# Altium footprint library CONN_TBLOCK_3P5_B.PcbLib: 36 footprints (part 1 of 3)
Each footprint in its own frame and in the unit in brackets; x right, y up, seen from the top. Pads: shape width x height; smd on the part's side, far side on the other; paste and mask are expansions set on the pad; w line width, h text height; cw(c..) or ccw(c..) is an arc to the next point about the centre after c.
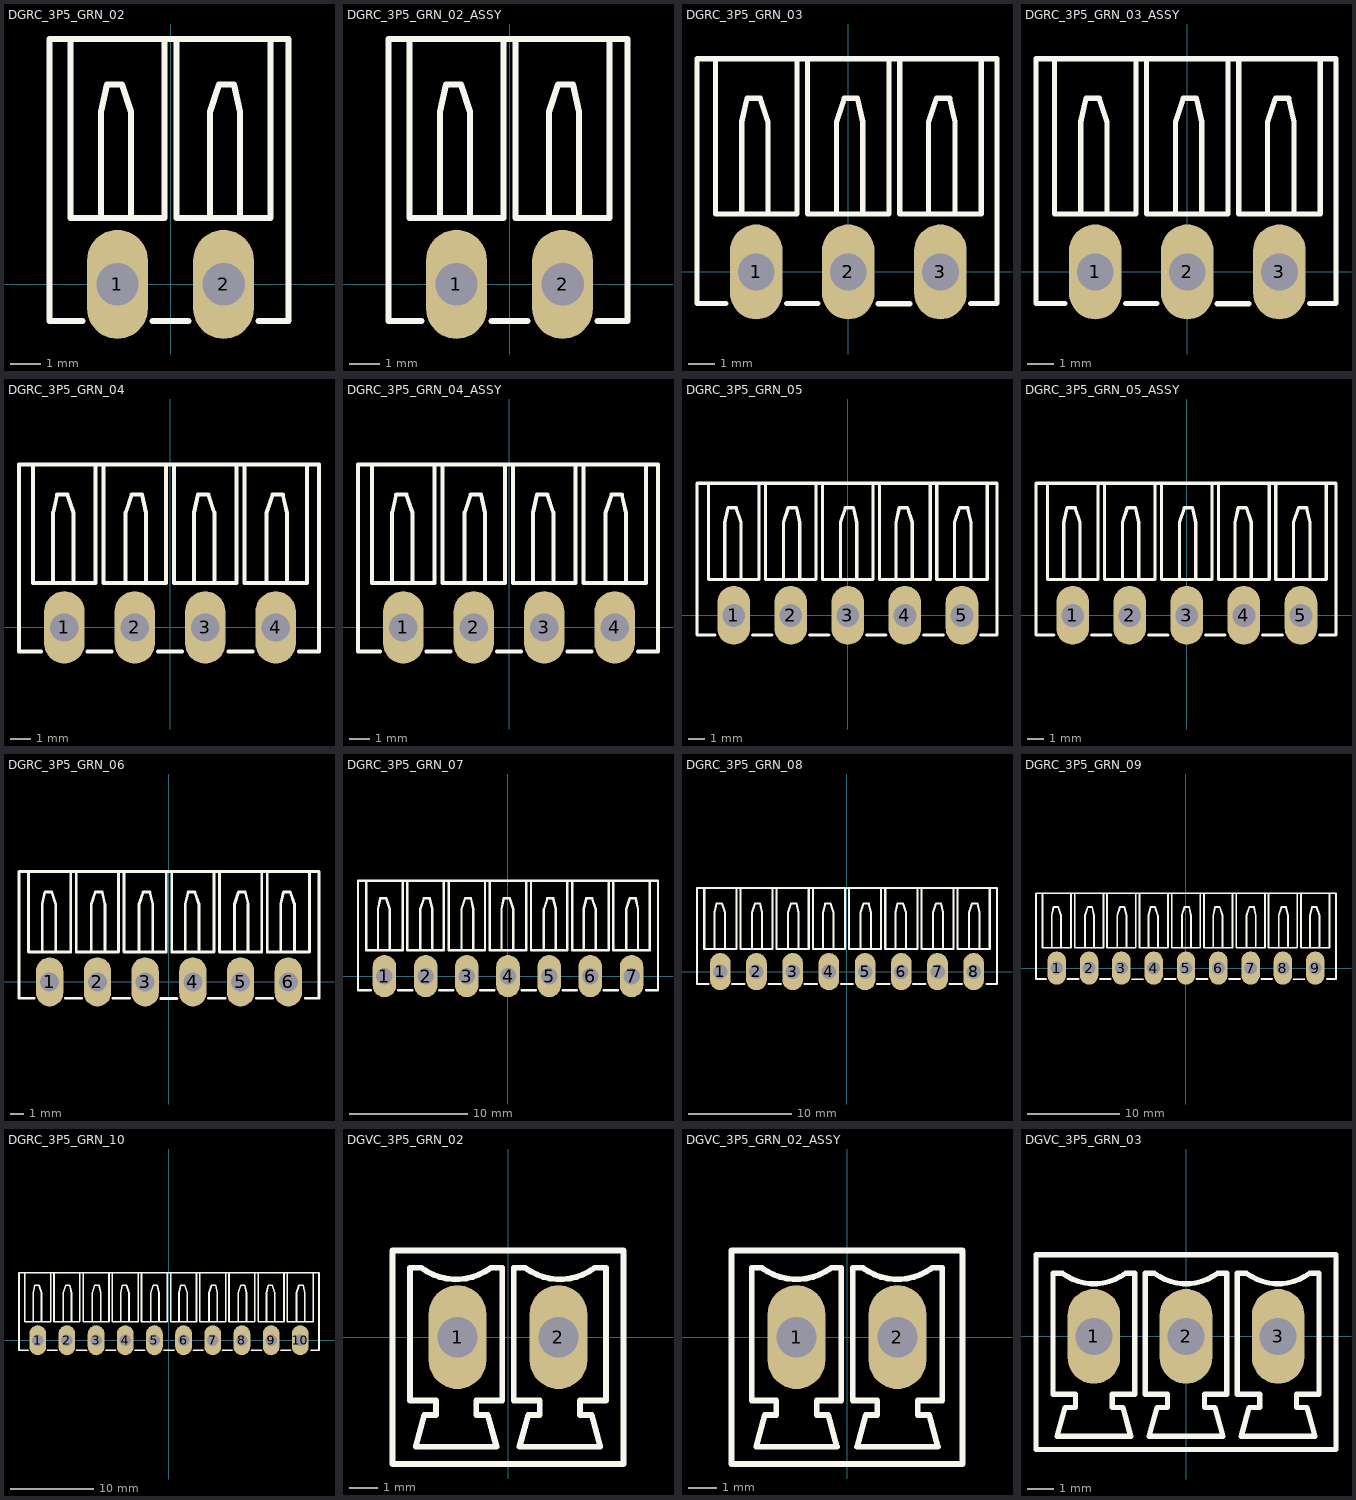
[diagram p0: the footprints below, top view; thin cyan lines are the x and y axes]

## DGRC_3P5_GRN_02 [mm] "Terminal Block Pluggable, 15EDGRC-3.5-0xP-14, Green, 8A/300v"
height 7
pads (2):
  oval 2x3.6 hole 1.4: 1(-1.75,0) 2(1.75,0)
Top Overlay:
  lines w0.2: -3.3,8.1 -3.3,2.2 -0.2,2.2 -0.2,8.1 ; -2.9,-1.2 -4,-1.2 -4,8.1 3.9,8.1 3.9,-1.2 2.9,-1.2 ; -2.3,2.2 -2.3,5.7 -2.1,6.6 -1.6,6.6 -1.3,5.7 -1.3,2.2 ; -0.6,-1.2 0.6,-1.2 ; 0.2,8.1 0.2,2.2 3.3,2.2 3.3,8.1 ; 1.3,2.2 1.3,5.7 1.6,6.6 2.1,6.6 2.3,5.7 2.3,2.2
3D body "15EDGRC-3.5-02P-14-00AH.STEP": height 7.3, standoff -3.4, extent -3.928,-1.143 3.872,8.057

## DGRC_3P5_GRN_02_ASSY [mm] "Terminal Block Pluggable, 15EDGRC-3.5-0xP-14, Green, 8A/300v"
height 7
pads (2):
  oval 2x3.6 hole 1.4: 1(-1.75,0) 2(1.75,0)
Top Overlay:
  lines w0.2: -3.3,8.1 -3.3,2.2 -0.2,2.2 -0.2,8.1 ; -2.9,-1.2 -4,-1.2 -4,8.1 3.9,8.1 3.9,-1.2 2.9,-1.2 ; -2.3,2.2 -2.3,5.7 -2.1,6.6 -1.6,6.6 -1.3,5.7 -1.3,2.2 ; -0.6,-1.2 0.6,-1.2 ; 0.2,8.1 0.2,2.2 3.3,2.2 3.3,8.1 ; 1.3,2.2 1.3,5.7 1.6,6.6 2.1,6.6 2.3,5.7 2.3,2.2
3D body "15EDG-3.5-2P(H-Vwt).STEP": height 8.76, standoff -2.5, extent -3.928,-1.171 3.872,16.967

## DGRC_3P5_GRN_03 [mm] "Terminal Block Pluggable, 15EDGRC-3.5-0xP-14, Green, 8A/300v"
height 7
pads (3):
  oval 2x3.6 hole 1.4: 1(-3.5,0) 2(0,0) 3(3.5,0)
Top Overlay:
  lines w0.2: -5.05,8.1 -5.05,2.2 -1.95,2.2 -1.95,8.1 ; -4.65,-1.2 -5.75,-1.2 -5.75,8.1 5.65,8.1 5.65,-1.2 4.65,-1.2 ; -4.05,2.2 -4.05,5.7 -3.85,6.6 -3.35,6.6 -3.05,5.7 -3.05,2.2 ; -2.35,-1.2 -1.15,-1.2 ; -1.55,8.1 -1.55,2.2 1.55,2.2 1.55,8.1 ; -0.45,2.2 -0.45,5.7 -0.15,6.6 0.35,6.6 0.55,5.7 0.55,2.2 ; 1.142,-1.208 2.342,-1.208 ; 1.95,8.1 1.95,2.2 5.05,2.2 5.05,8.1 ; 3.05,2.2 3.05,5.7 3.35,6.6 3.85,6.6 4.05,5.7 4.05,2.2
3D body "15EDGRC-3.5-03P-14-00AH.STEP": height 7.41, standoff -3.29, extent -5.706,-1.143 5.594,8.057

## DGRC_3P5_GRN_03_ASSY [mm] "Terminal Block Pluggable, 15EDGRC-3.5-0xP-14, Green, 8A/300v"
height 7
pads (3):
  oval 2x3.6 hole 1.4: 1(-3.5,0) 2(0,0) 3(3.5,0)
Top Overlay:
  lines w0.2: -5.05,8.1 -5.05,2.2 -1.95,2.2 -1.95,8.1 ; -4.65,-1.2 -5.75,-1.2 -5.75,8.1 5.65,8.1 5.65,-1.2 4.65,-1.2 ; -4.05,2.2 -4.05,5.7 -3.85,6.6 -3.35,6.6 -3.05,5.7 -3.05,2.2 ; -2.35,-1.2 -1.15,-1.2 ; -1.55,8.1 -1.55,2.2 1.55,2.2 1.55,8.1 ; -0.45,2.2 -0.45,5.7 -0.15,6.6 0.35,6.6 0.55,5.7 0.55,2.2 ; 1.142,-1.208 2.342,-1.208 ; 1.95,8.1 1.95,2.2 5.05,2.2 5.05,8.1 ; 3.05,2.2 3.05,5.7 3.35,6.6 3.85,6.6 4.05,5.7 4.05,2.2
3D body "15EDG-3.5-3P(H-Vwt).STEP": height 9.94, standoff -1.32, extent -5.692,-1.222 5.608,16.916

## DGRC_3P5_GRN_04 [mm] "Terminal Block Pluggable, 15EDGRC-3.5-0xP-14, Green, 8A/300v"
height 7
pads (4):
  oval 2x3.6 hole 1.4: 1(-5.25,0) 2(-1.75,0) 3(1.75,0) 4(5.25,0)
Top Overlay:
  lines w0.2: -6.8,8.1 -6.8,2.2 -3.7,2.2 -3.7,8.1 ; -6.4,-1.2 -7.5,-1.2 -7.5,8.1 7.4,8.1 7.4,-1.2 6.4,-1.2 ; -5.8,2.2 -5.8,5.7 -5.6,6.6 -5.1,6.6 -4.8,5.7 -4.8,2.2 ; -4.1,-1.2 -2.9,-1.2 ; -3.3,8.1 -3.3,2.2 -0.2,2.2 -0.2,8.1 ; -2.2,2.2 -2.2,5.7 -1.9,6.6 -1.4,6.6 -1.2,5.7 -1.2,2.2 ; -0.6,-1.2 0.6,-1.2 ; 0.2,8.1 0.2,2.2 3.3,2.2 3.3,8.1 ; 1.2,2.2 1.2,5.7 1.4,6.6 1.9,6.6 2.2,5.7 2.2,2.2 ; 2.9,-1.2 4.1,-1.2 ; 3.7,8.1 3.7,2.2 6.8,2.2 6.8,8.1 ; 4.8,2.2 4.8,5.7 5.1,6.6 5.6,6.6 5.8,5.7 5.8,2.2
3D body "15EDGRC-3.5-04P-14-00AH.STEP": height 7.41, standoff -3.29, extent -7.357,-1.143 7.443,8.057

## DGRC_3P5_GRN_04_ASSY [mm] "Terminal Block Pluggable, 15EDGRC-3.5-0xP-14, Green, 8A/300v"
height 7
pads (4):
  oval 2x3.6 hole 1.4: 1(-5.25,0) 2(-1.75,0) 3(1.75,0) 4(5.25,0)
Top Overlay:
  lines w0.2: -6.8,8.1 -6.8,2.2 -3.7,2.2 -3.7,8.1 ; -6.4,-1.2 -7.5,-1.2 -7.5,8.1 7.4,8.1 7.4,-1.2 6.4,-1.2 ; -5.8,2.2 -5.8,5.7 -5.6,6.6 -5.1,6.6 -4.8,5.7 -4.8,2.2 ; -4.1,-1.2 -2.9,-1.2 ; -3.3,8.1 -3.3,2.2 -0.2,2.2 -0.2,8.1 ; -2.2,2.2 -2.2,5.7 -1.9,6.6 -1.4,6.6 -1.2,5.7 -1.2,2.2 ; -0.6,-1.2 0.6,-1.2 ; 0.2,8.1 0.2,2.2 3.3,2.2 3.3,8.1 ; 1.2,2.2 1.2,5.7 1.4,6.6 1.9,6.6 2.2,5.7 2.2,2.2 ; 2.9,-1.2 4.1,-1.2 ; 3.7,8.1 3.7,2.2 6.8,2.2 6.8,8.1 ; 4.8,2.2 4.8,5.7 5.1,6.6 5.6,6.6 5.8,5.7 5.8,2.2
3D body "15EDG-3.5-4P(H-Vwt).STEP": height 8.76, standoff -2.5, extent -7.428,-1.171 7.372,16.967

## DGRC_3P5_GRN_05 [mm] "Terminal Block Pluggable, 15EDGRC-3.5-0xP-14, Green, 8A/300v"
height 7
pads (5):
  oval 2x3.6 hole 1.4: 1(-7,0) 2(-3.5,0) 3(0,0) 4(3.5,0) 5(7,0)
Top Overlay:
  lines w0.2: -8.55,8.1 -8.55,2.2 -5.45,2.2 -5.45,8.1 ; -8.15,-1.2 -9.25,-1.2 -9.25,8.1 9.15,8.1 9.15,-1.2 8.15,-1.2 ; -7.55,2.2 -7.55,5.7 -7.35,6.6 -6.85,6.6 -6.55,5.7 -6.55,2.2 ; -5.85,-1.2 -4.65,-1.2 ; -5.05,8.1 -5.05,2.2 -1.95,2.2 -1.95,8.1 ; -3.95,2.2 -3.95,5.7 -3.65,6.6 -3.15,6.6 -2.95,5.7 -2.95,2.2 ; -2.35,-1.2 -1.15,-1.2 ; -1.55,8.1 -1.55,2.2 1.55,2.2 1.55,8.1 ; -0.45,2.2 -0.45,5.7 -0.15,6.6 0.35,6.6 0.55,5.7 0.55,2.2 ; 1.142,-1.208 2.342,-1.208 ; 1.95,8.1 1.95,2.2 5.05,2.2 5.05,8.1 ; 2.95,2.2 2.95,5.7 3.15,6.6 3.65,6.6 3.95,5.7 3.95,2.2 ; 4.65,-1.2 5.85,-1.2 ; 5.45,8.1 5.45,2.2 8.55,2.2 8.55,8.1 ; 6.55,2.2 6.55,5.7 6.85,6.6 7.35,6.6 7.55,5.7 7.55,2.2
3D body "15EDGRC-3.5-05P-14-00AH.STEP": height 7.41, standoff -3.29, extent -9.178,-1.211 9.122,7.989

## DGRC_3P5_GRN_05_ASSY [mm] "Terminal Block Pluggable, 15EDGRC-3.5-0xP-14, Green, 8A/300v"
height 7
pads (5):
  oval 2x3.6 hole 1.4: 1(-7,0) 2(-3.5,0) 3(0,0) 4(3.5,0) 5(7,0)
Top Overlay:
  lines w0.2: -8.55,8.1 -8.55,2.2 -5.45,2.2 -5.45,8.1 ; -8.15,-1.2 -9.25,-1.2 -9.25,8.1 9.15,8.1 9.15,-1.2 8.15,-1.2 ; -7.55,2.2 -7.55,5.7 -7.35,6.6 -6.85,6.6 -6.55,5.7 -6.55,2.2 ; -5.85,-1.2 -4.65,-1.2 ; -5.05,8.1 -5.05,2.2 -1.95,2.2 -1.95,8.1 ; -3.95,2.2 -3.95,5.7 -3.65,6.6 -3.15,6.6 -2.95,5.7 -2.95,2.2 ; -2.35,-1.2 -1.15,-1.2 ; -1.55,8.1 -1.55,2.2 1.55,2.2 1.55,8.1 ; -0.45,2.2 -0.45,5.7 -0.15,6.6 0.35,6.6 0.55,5.7 0.55,2.2 ; 1.142,-1.208 2.342,-1.208 ; 1.95,8.1 1.95,2.2 5.05,2.2 5.05,8.1 ; 2.95,2.2 2.95,5.7 3.15,6.6 3.65,6.6 3.95,5.7 3.95,2.2 ; 4.65,-1.2 5.85,-1.2 ; 5.45,8.1 5.45,2.2 8.55,2.2 8.55,8.1 ; 6.55,2.2 6.55,5.7 6.85,6.6 7.35,6.6 7.55,5.7 7.55,2.2
3D body "15EDG-3.5-5P(H-Vwt).STEP": height 8.76, standoff -2.5, extent -9.178,-1.171 9.122,16.967

## DGRC_3P5_GRN_06 [mm] "Terminal Block Pluggable, 15EDGRC-3.5-0xP-14, Green, 8A/300v"
height 7
pads (6):
  oval 2x3.6 hole 1.4: 1(-8.75,0) 2(-5.25,0) 3(-1.75,0) 4(1.75,0) 5(5.25,0) 6(8.75,0)
Top Overlay:
  lines w0.2: -10.3,8.1 -10.3,2.2 -7.2,2.2 -7.2,8.1 ; -9.9,-1.2 -11,-1.2 -11,8.1 11,8.1 11,-1.2 10,-1.2 ; -9.3,2.2 -9.3,5.7 -9.1,6.6 -8.6,6.6 -8.3,5.7 -8.3,2.2 ; -7.6,-1.2 -6.4,-1.2 ; -6.8,8.1 -6.8,2.2 -3.7,2.2 -3.7,8.1 ; -5.7,2.2 -5.7,5.7 -5.4,6.6 -4.9,6.6 -4.7,5.7 -4.7,2.2 ; -4.1,-1.2 -2.9,-1.2 ; -3.3,8.1 -3.3,2.2 -0.2,2.2 -0.2,8.1 ; -2.2,2.2 -2.2,5.7 -1.9,6.6 -1.4,6.6 -1.2,5.7 -1.2,2.2 ; -0.608,-1.208 0.592,-1.208 ; 0.2,8.1 0.2,2.2 3.3,2.2 3.3,8.1 ; 1.2,2.2 1.2,5.7 1.4,6.6 1.9,6.6 2.2,5.7 2.2,2.2 ; 2.9,-1.2 4.1,-1.2 ; 3.7,8.1 3.7,2.2 6.8,2.2 6.8,8.1 ; 4.8,2.2 4.8,5.7 5.1,6.6 5.6,6.6 5.8,5.7 5.8,2.2 ; 6.4,-1.2 7.6,-1.2 ; 7.2,8.1 7.2,2.2 10.3,2.2 10.3,8.1 ; 8.2,2.2 8.2,5.7 8.4,6.6 8.9,6.6 9.2,5.7 9.2,2.2
3D body "15EDGRC-3.5-03P-14-00AH.STEP": height 7.41, standoff -3.29, extent -10.956,-1.143 0.344,8.057
3D body "15EDGRC-3.5-03P-14-00AH.STEP": height 7.41, standoff -3.29, extent -0.456,-1.143 10.844,8.057

## DGRC_3P5_GRN_07 [mm] "Terminal Block Pluggable, 15EDGRC-3.5-0xP-14, Green, 8A/300v"
height 7
pads (7):
  oval 2x3.6 hole 1.4: 1(-10.5,0) 2(-7,0) 3(-3.5,0) 4(0,0) 5(3.5,0) 6(7,0) 7(10.5,0)
Top Overlay:
  lines w0.2: -12.05,8.1 -12.05,2.2 -8.95,2.2 -8.95,8.1 ; -11.65,-1.2 -12.75,-1.2 -12.75,8.1 12.75,8.1 12.75,-1.2 11.75,-1.2 ; -11.05,2.2 -11.05,5.7 -10.85,6.6 -10.35,6.6 -10.05,5.7 -10.05,2.2 ; -9.35,-1.2 -8.15,-1.2 ; -8.55,8.1 -8.55,2.2 -5.45,2.2 -5.45,8.1 ; -7.45,2.2 -7.45,5.7 -7.15,6.6 -6.65,6.6 -6.45,5.7 -6.45,2.2 ; -5.85,-1.2 -4.65,-1.2 ; -5.05,8.1 -5.05,2.2 -1.95,2.2 -1.95,8.1 ; -3.95,2.2 -3.95,5.7 -3.65,6.6 -3.15,6.6 -2.95,5.7 -2.95,2.2 ; -2.358,-1.208 -1.158,-1.208 ; -1.55,8.1 -1.55,2.2 1.55,2.2 1.55,8.1 ; -0.55,2.2 -0.55,5.7 -0.35,6.6 0.15,6.6 0.45,5.7 0.45,2.2 ; 1.15,-1.2 2.35,-1.2 ; 1.95,8.1 1.95,2.2 5.05,2.2 5.05,8.1 ; 3.05,2.2 3.05,5.7 3.35,6.6 3.85,6.6 4.05,5.7 4.05,2.2 ; 4.65,-1.2 5.85,-1.2 ; 5.45,8.1 5.45,2.2 8.55,2.2 8.55,8.1 ; 6.45,2.2 6.45,5.7 6.65,6.6 7.15,6.6 7.45,5.7 7.45,2.2 ; 8.15,-1.2 9.35,-1.2 ; 8.95,8.1 8.95,2.2 12.05,2.2 12.05,8.1 ; 10.05,2.2 10.05,5.7 10.35,6.6 10.85,6.6 11.05,5.7 11.05,2.2
3D body "15EDGRC-3.5-04P-14-00AH.STEP": height 7.41, standoff -3.29, extent -12.607,-1.143 2.193,8.057
3D body "15EDGRC-3.5-03P-14-00AH.STEP": height 7.41, standoff -3.29, extent 1.294,-1.143 12.594,8.057

## DGRC_3P5_GRN_08 [mm] "Terminal Block Pluggable, 15EDGRC-3.5-0xP-14, Green, 8A/300v"
height 7
pads (8):
  oval 2x3.6 hole 1.4: 1(-12.25,0) 2(-8.75,0) 3(-5.25,0) 4(-1.75,0) 5(1.75,0) 6(5.25,0) 7(8.75,0) 8(12.25,0)
Top Overlay:
  lines w0.2: -13.8,8.1 -13.8,2.2 -10.7,2.2 -10.7,8.1 ; -13.4,-1.2 -14.5,-1.2 -14.5,8.1 14.5,8.1 14.5,-1.2 13.5,-1.2 ; -12.8,2.2 -12.8,5.7 -12.6,6.6 -12.1,6.6 -11.8,5.7 -11.8,2.2 ; -11.1,-1.2 -9.9,-1.2 ; -10.3,8.1 -10.3,2.2 -7.2,2.2 -7.2,8.1 ; -9.2,2.2 -9.2,5.7 -8.9,6.6 -8.4,6.6 -8.2,5.7 -8.2,2.2 ; -7.6,-1.2 -6.4,-1.2 ; -6.8,8.1 -6.8,2.2 -3.7,2.2 -3.7,8.1 ; -5.7,2.2 -5.7,5.7 -5.4,6.6 -4.9,6.6 -4.7,5.7 -4.7,2.2 ; -4.108,-1.208 -2.908,-1.208 ; -3.3,8.1 -3.3,2.2 -0.2,2.2 -0.2,8.1 ; -2.3,2.2 -2.3,5.7 -2.1,6.6 -1.6,6.6 -1.3,5.7 -1.3,2.2 ; -0.6,-1.2 0.6,-1.2 ; 0.2,8.1 0.2,2.2 3.3,2.2 3.3,8.1 ; 1.3,2.2 1.3,5.7 1.6,6.6 2.1,6.6 2.3,5.7 2.3,2.2 ; 2.9,-1.2 4.1,-1.2 ; 3.7,8.1 3.7,2.2 6.8,2.2 6.8,8.1 ; 4.7,2.2 4.7,5.7 4.9,6.6 5.4,6.6 5.7,5.7 5.7,2.2 ; 6.4,-1.2 7.6,-1.2 ; 7.2,8.1 7.2,2.2 10.3,2.2 10.3,8.1 ; 8.3,2.2 8.3,5.7 8.6,6.6 9.1,6.6 9.3,5.7 9.3,2.2 ; 9.9,-1.2 11.1,-1.2 ; 10.7,8.1 10.7,2.2 13.8,2.2 13.8,8.1 ; 11.8,2.2 11.8,5.7 12.1,6.6 12.6,6.6 12.8,5.7 12.8,2.2
3D body "15EDGRC-3.5-04P-14-00AH.STEP": height 7.41, standoff -3.29, extent -14.357,-1.143 0.443,8.057
3D body "15EDGRC-3.5-04P-14-00AH.STEP": height 7.41, standoff -3.29, extent -0.357,-1.143 14.443,8.057

## DGRC_3P5_GRN_09 [mm] "Terminal Block Pluggable, 15EDGRC-3.5-0xP-14, Green, 8A/300v"
height 7
pads (9):
  oval 2x3.6 hole 1.4: 1(-14,0) 2(-10.5,0) 3(-7,0) 4(-3.5,0) 5(0,0) 6(3.5,0) 7(7,0) 8(10.5,0) 9(14,0)
Top Overlay:
  lines w0.2: -15.55,8.1 -15.55,2.2 -12.45,2.2 -12.45,8.1 ; -15.15,-1.2 -16.25,-1.2 -16.25,8.1 16.25,8.1 16.25,-1.2 15.25,-1.2 ; -14.55,2.2 -14.55,5.7 -14.35,6.6 -13.85,6.6 -13.55,5.7 -13.55,2.2 ; -12.85,-1.2 -11.65,-1.2 ; -12.05,8.1 -12.05,2.2 -8.95,2.2 -8.95,8.1 ; -10.95,2.2 -10.95,5.7 -10.65,6.6 -10.15,6.6 -9.95,5.7 -9.95,2.2 ; -9.35,-1.2 -8.15,-1.2 ; -8.55,8.1 -8.55,2.2 -5.45,2.2 -5.45,8.1 ; -7.45,2.2 -7.45,5.7 -7.15,6.6 -6.65,6.6 -6.45,5.7 -6.45,2.2 ; -5.858,-1.208 -4.658,-1.208 ; -5.05,8.1 -5.05,2.2 -1.95,2.2 -1.95,8.1 ; -4.05,2.2 -4.05,5.7 -3.85,6.6 -3.35,6.6 -3.05,5.7 -3.05,2.2 ; -2.35,-1.2 -1.15,-1.2 ; -1.55,8.1 -1.55,2.2 1.55,2.2 1.55,8.1 ; -0.45,2.2 -0.45,5.7 -0.15,6.6 0.35,6.6 0.55,5.7 0.55,2.2 ; 1.15,-1.2 2.35,-1.2 ; 1.95,8.1 1.95,2.2 5.05,2.2 5.05,8.1 ; 2.95,2.2 2.95,5.7 3.15,6.6 3.65,6.6 3.95,5.7 3.95,2.2 ; 4.65,-1.2 5.85,-1.2 ; 5.45,8.1 5.45,2.2 8.55,2.2 8.55,8.1 ; 6.55,2.2 6.55,5.7 6.85,6.6 7.35,6.6 7.55,5.7 7.55,2.2 ; 8.15,-1.2 9.35,-1.2 ; 8.95,8.1 8.95,2.2 12.05,2.2 12.05,8.1 ; 10.05,2.2 10.05,5.7 10.35,6.6 10.85,6.6 11.05,5.7 11.05,2.2 ; 11.642,-1.208 12.842,-1.208 ; 12.45,8.1 12.45,2.2 15.55,2.2 15.55,8.1 ; 13.45,2.2 13.45,5.7 13.65,6.6 14.15,6.6 14.45,5.7 14.45,2.2
3D body "15EDGRC-3.5-04P-14-00AH.STEP": height 7.41, standoff -3.29, extent 1.393,-1.143 16.193,8.057
3D body "15EDGRC-3.5-05P-14-00AH.STEP": height 7.41, standoff -3.29, extent -16.178,-1.211 2.122,7.989

## DGRC_3P5_GRN_10 [mm] "Terminal Block Pluggable, 15EDGRC-3.5-xxP-14, Green, 8A/300v"
height 7
pads (10):
  oval 2x3.6 hole 1.4: 1(-15.75,0) 2(-12.25,0) 3(-8.75,0) 4(-5.25,0) 5(-1.75,0) 6(1.75,0) 7(5.25,0) 8(8.75,0) 9(12.25,0) 10(15.75,0)
Top Overlay:
  lines w0.2: -17.3,8.1 -17.3,2.2 -14.2,2.2 -14.2,8.1 ; -16.9,-1.2 -18,-1.2 -18,8.1 18,8.1 18,-1.2 17,-1.2 ; -16.3,2.2 -16.3,5.7 -16.1,6.6 -15.6,6.6 -15.3,5.7 -15.3,2.2 ; -14.6,-1.2 -13.4,-1.2 ; -13.8,8.1 -13.8,2.2 -10.7,2.2 -10.7,8.1 ; -12.7,2.2 -12.7,5.7 -12.4,6.6 -11.9,6.6 -11.7,5.7 -11.7,2.2 ; -11.1,-1.2 -9.9,-1.2 ; -10.3,8.1 -10.3,2.2 -7.2,2.2 -7.2,8.1 ; -9.2,2.2 -9.2,5.7 -8.9,6.6 -8.4,6.6 -8.2,5.7 -8.2,2.2 ; -7.608,-1.208 -6.408,-1.208 ; -6.8,8.1 -6.8,2.2 -3.7,2.2 -3.7,8.1 ; -5.8,2.2 -5.8,5.7 -5.6,6.6 -5.1,6.6 -4.8,5.7 -4.8,2.2 ; -4.1,-1.2 -2.9,-1.2 ; -3.3,8.1 -3.3,2.2 -0.2,2.2 -0.2,8.1 ; -2.2,2.2 -2.2,5.7 -1.9,6.6 -1.4,6.6 -1.2,5.7 -1.2,2.2 ; -0.6,-1.2 0.6,-1.2 ; 0.2,8.1 0.2,2.2 3.3,2.2 3.3,8.1 ; 1.2,2.2 1.2,5.7 1.4,6.6 1.9,6.6 2.2,5.7 2.2,2.2 ; 2.9,-1.2 4.1,-1.2 ; 3.7,8.1 3.7,2.2 6.8,2.2 6.8,8.1 ; 4.8,2.2 4.8,5.7 5.1,6.6 5.6,6.6 5.8,5.7 5.8,2.2 ; 6.4,-1.2 7.6,-1.2 ; 7.2,8.1 7.2,2.2 10.3,2.2 10.3,8.1 ; 8.3,2.2 8.3,5.7 8.6,6.6 9.1,6.6 9.3,5.7 9.3,2.2 ; 9.892,-1.208 11.092,-1.208 ; 10.7,8.1 10.7,2.2 13.8,2.2 13.8,8.1 ; 11.7,2.2 11.7,5.7 11.9,6.6 12.4,6.6 12.7,5.7 12.7,2.2 ; 13.4,-1.2 14.6,-1.2 ; 14.2,8.1 14.2,2.2 17.3,2.2 17.3,8.1 ; 15.3,2.2 15.3,5.7 15.6,6.6 16.1,6.6 16.3,5.7 16.3,2.2
3D body "15EDGRC-3.5-05P-14-00AH.STEP": height 7.41, standoff -3.29, extent -0.428,-1.211 17.872,7.989
3D body "15EDGRC-3.5-05P-14-00AH.STEP": height 7.41, standoff -3.29, extent -17.928,-1.211 0.372,7.989

## DGVC_3P5_GRN_02 [mm] "Terminal Block Pluggable, 15EDGVC-3.5-0xP-14, Green, 8A/300v"
pads (2):
  oval 2x3.6 hole 1.4: 1(-1.75,0) 2(1.75,0)
Top Overlay:
  lines w0.2: -3,2.4 ccw(c-1.8,4) -0.6,2.4 -0.2,2.4 -0.2,-2.2 -1.1,-2.2 -1.1,-2.7 -0.7,-2.7 -0.4,-3.8 -3.2,-3.8 -2.9,-2.7 -2.5,-2.7 -2.5,-2.2 -3.4,-2.2 -3.4,2.4 -3,2.4 ; -3,2.4 -3,2.4 ; 3,2.4 cw(c1.8,4) 0.6,2.4 0.2,2.4 0.2,-2.2 1.1,-2.2 1.1,-2.7 0.7,-2.7 0.4,-3.8 3.2,-3.8 2.9,-2.7 2.5,-2.7 2.5,-2.2 3.4,-2.2 3.4,2.4 3,2.4 ; 3,2.4 3,2.4 ; -4,-4.4 -4,3 4,3 4,-4.4 -4,-4.4
3D body "15EDGVC-3.5-02P-14-00AH.STEP": height 9.2, standoff -3.6, extent -3.916,-4.318 3.884,2.882

## DGVC_3P5_GRN_02_ASSY [mm] "Terminal Block Pluggable, 15EDGVC-3.5-0xP-14, Green, 8A/300v"
pads (2):
  oval 2x3.6 hole 1.4: 1(-1.75,0) 2(1.75,0)
Top Overlay:
  lines w0.2: -2.5,-2.2 -3.3,-2.2 -3.3,2.4 -2.95,2.4 ccw(c-1.75,4) -0.55,2.4 -0.2,2.4 -0.2,-2.2 -1.05,-2.2 -1.05,-2.7 -0.65,-2.7 -0.35,-3.8 -3.15,-3.8 -2.85,-2.7 -2.45,-2.7 -2.45,-2.2 ; 1,-2.2 0.2,-2.2 0.2,2.4 0.55,2.4 ccw(c1.75,4) 2.95,2.4 3.3,2.4 3.3,-2.2 2.45,-2.2 2.45,-2.7 2.85,-2.7 3.15,-3.8 0.35,-3.8 0.65,-2.7 1.05,-2.7 1.05,-2.2 ; -4,-4.4 4,-4.4 4,3 -4,3 -4,-4.4
3D body "15EDG-3.5-2P(V-Hhb).STEP": height 21.7, standoff -3.6, extent -3.905,-5.235 3.895,5.165

## DGVC_3P5_GRN_03 [mm] "Terminal Block Pluggable, 15EDGVC-3.5-0xP-14, Green, 8A/300v"
pads (3):
  oval 2x3.6 hole 1.4: 1(-3.5,0) 2(0,0) 3(3.5,0)
Top Overlay:
  lines w0.2: -4.25,-2.2 -5.05,-2.2 -5.05,2.4 -4.7,2.4 ccw(c-3.5,4) -2.3,2.4 -1.95,2.4 -1.95,-2.2 -2.8,-2.2 -2.8,-2.7 -2.4,-2.7 -2.1,-3.8 -4.9,-3.8 -4.6,-2.7 -4.2,-2.7 -4.2,-2.2 ; -0.75,-2.2 -1.55,-2.2 -1.55,2.4 -1.2,2.4 ccw(c0,4) 1.2,2.4 1.55,2.4 1.55,-2.2 0.7,-2.2 0.7,-2.7 1.1,-2.7 1.4,-3.8 -1.4,-3.8 -1.1,-2.7 -0.7,-2.7 -0.7,-2.2 ; 2.75,-2.2 1.95,-2.2 1.95,2.4 2.3,2.4 ccw(c3.5,4) 4.7,2.4 5.05,2.4 5.05,-2.2 4.2,-2.2 4.2,-2.7 4.6,-2.7 4.9,-3.8 2.1,-3.8 2.4,-2.7 2.8,-2.7 2.8,-2.2 ; -5.7,-4.3 5.7,-4.3 5.7,3.1 -5.7,3.1 -5.7,-4.3
3D body "15EDGVC-3.5-03P-14-00AH.STEP": height 9.2, standoff -3.6, extent -5.653,-4.208 5.647,2.992